# Altium footprint library Footprints.PcbLib: 236 footprints (part 10 of 15)
Each footprint in its own frame and in the unit in brackets; x right, y up, seen from the top. Pads: shape width x height; smd on the part's side, far side on the other; paste and mask are expansions set on the pad; w line width, h text height; cw(c..) or ccw(c..) is an arc to the next point about the centre after c.
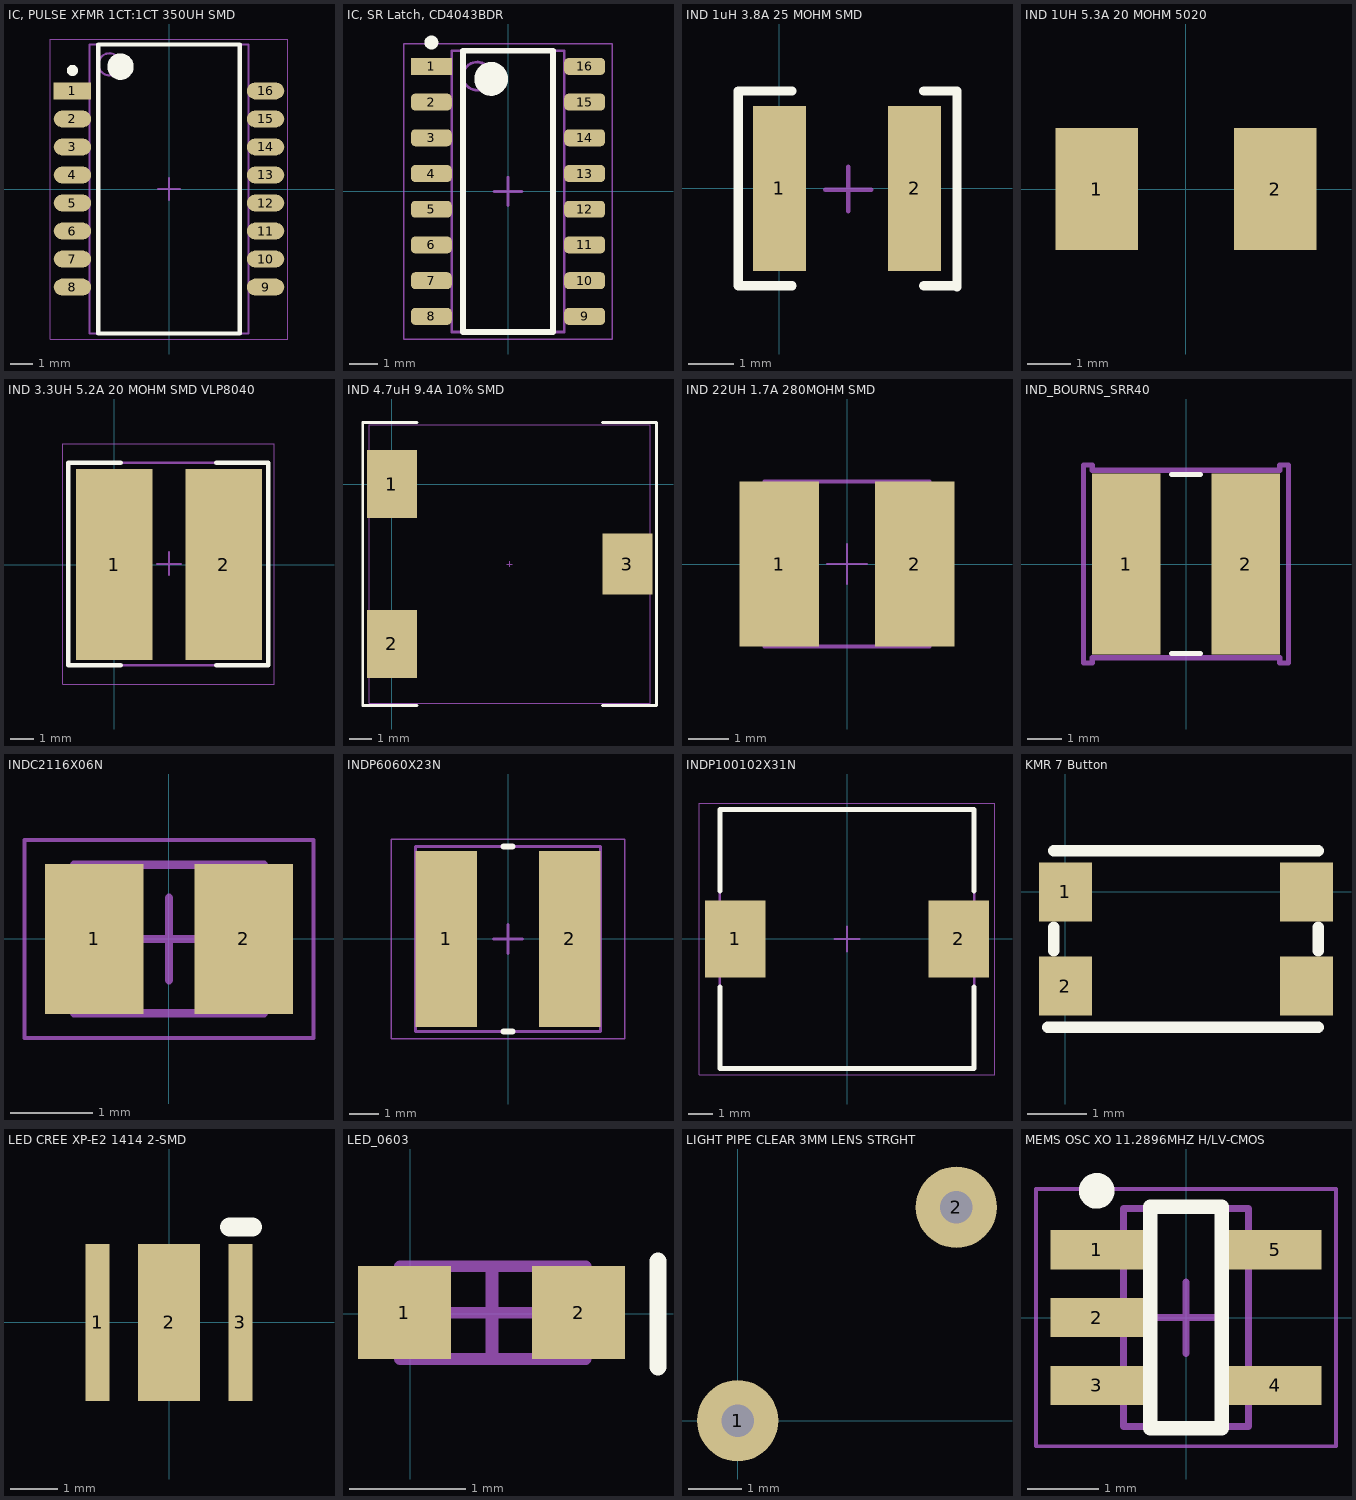
[diagram p9: the footprints below, top view; thin cyan lines are the x and y axes]

## IC, PULSE XFMR 1CT:1CT 350UH SMD [mm] "PULSE XFMR 1CT:1CT 350UH SMD"
height 5.9
pads (16):
  rect 1.7x0.76 smd: 1(-4.375,4.445)
  oval 1.7x0.76 smd: 2(-4.375,3.175) 3(-4.375,1.905) 4(-4.375,0.635) 5(-4.375,-0.635) 6(-4.375,-1.905) 7(-4.375,-3.175) 8(-4.375,-4.445) 9(4.375,-4.445) 10(4.375,-3.175) 11(4.375,-1.905) 12(4.375,-0.635) 13(4.375,0.635) 14(4.375,1.905) 15(4.375,3.175) 16(4.375,4.445)
Top Overlay:
  circle w0.6: c-2.2,5.55 r0.3
  circle w0.25: c-4.375,5.375 r0.125
  lines w0.2: -3.2,-6.55 3.2,-6.55 3.2,6.55 -3.2,6.55 -3.2,-6.55
Mechanical 13:
  circle w0.1: c-2.7,5.65 r0.5
  lines w0.1: -3.6,-6.55 3.6,-6.55 3.6,6.55 -3.6,6.55 -3.6,-6.55
Mechanical 15:
  lines w0.05: -5.375,-6.8 5.375,-6.8 5.375,6.8 -5.375,6.8 -5.375,-6.8
  lines w0.1: -0.5,0 0.5,0 ; 0,-0.5 0,0.5
3D body "1CT 350UH SMD.step": height 5.9, standoff 0, extent -4.65,-6.55 4.65,6.55

## IC, SR Latch, CD4043BDR [mm] "SR LATCH"
height 1.75
pads (16):
  rect 1.45x0.6 smd: 1(-2.725,4.445)
  rrect50% 1.45x0.6 smd: 2(-2.725,3.175) 3(-2.725,1.905) 4(-2.725,0.635) 5(-2.725,-0.635) 6(-2.725,-1.905) 7(-2.725,-3.175) 8(-2.725,-4.445) 9(2.725,-4.445) 10(2.725,-3.175) 11(2.725,-1.905) 12(2.725,-0.635) 13(2.725,0.635) 14(2.725,1.905) 15(2.725,3.175) 16(2.725,4.445)
Top Overlay:
  circle w0.6: c-0.6,4 r0.3
  circle w0.25: c-2.725,5.295 r0.125
  lines w0.2: -1.6,-5 1.6,-5 1.6,5 -1.6,5 -1.6,-5
Mechanical 13:
  circle w0.1: c-1.1,4.1 r0.5
  lines w0.1: -2,-5 2,-5 2,5 -2,5 -2,-5
Mechanical 15:
  lines w0.05: -3.7,-5.25 3.7,-5.25 3.7,5.25 -3.7,5.25 -3.7,-5.25
  lines w0.1: -0.5,0 0.5,0 ; 0,-0.5 0,0.5
3D body: height 1.75, standoff 0.1, extent -2,-5 2,5

## IND 1uH 3.8A 25 MOHM SMD [mm]
pads (2):
  rect 1.15x3.6 smd: 1(0,0) 2(2.95,0)
Top Overlay:
  lines w0.2: 0.275,-2.125 -0.9,-2.125 -0.9,2.125 0.275,2.125 ; 3.15,-2.125 3.875,-2.125 ; 3.15,2.125 3.875,2.125 ; 3.875,-2.15 3.875,2.1
Courtyard Top:
  lines w0.1: 1,-0.025 2,-0.025 ; 1.5,-0.5 1.5,0.475
3D body "IFSC-1515AH-01.STEP": height 1.65, standoff -0.06, extent -0.5,-2 3.45,1.95

## IND 1UH 5.3A 20 MOHM 5020 [mm]
pads (2):
  rect 1.9x2.8 smd: 1(-2.05,0) 2(2.05,0)
3D body "74437334010_Download_STP_WE-LHMI-5020_rev1.stp": height 1.8, standoff 0, extent -2.85,-2.6 2.85,2.6

## IND 3.3UH 5.2A 20 MOHM SMD VLP8040 [mm] "IND 3.3UH 5.2A 20 MOHM SMD"
height 4
pads (2):
  rect 3.3x8.2 smd: 1(0,0) 2(4.7,0)
Top Overlay:
  lines w0.2: 0.275,-4.325 -1.975,-4.325 -1.975,4.375 0.275,4.375 ; 4.375,-4.325 6.625,-4.325 6.625,4.375 4.375,4.375
Assembly Top:
  lines w0.1: -1.975,-4.325 -1.975,4.375 6.625,4.375 6.625,-4.325 -1.975,-4.325
Courtyard Top:
  lines w0.05: -2.225,-5.15 -2.225,5.2 6.875,5.2 6.875,-5.15 -2.225,-5.15
  lines w0.1: 1.85,0.025 2.85,0.025 ; 2.35,-0.45 2.35,0.525
3D body "IND 3.3UH 5.2A 20 MOHM SMD VLP8040.step": height 4.1, standoff 0, extent -1.625,-4.675 6.975,3.925

## IND 4.7uH 9.4A 10% SMD [mil]
pads (3):
  rect 89x121 smd: 1(0,0) 2(0,-284)
  rect 89x109 smd: 3(419,-142)
Top Overlay:
  lines w5: 44.5,-394 -52,-394 -52,110 44.5,110 ; 374.5,-394 471,-394 471,109.99 374.5,110
Mechanical 13:
  lines w1: 204.5,-142 214.5,-142 ; 209.5,-147 209.5,-137
3D Body Top (Mech14):
  lines w1: -40.5,-390 -40.5,106 459.5,106 459.5,-390 -40.5,-390
3D body "SER1360.STEP": height 228.38, standoff 0.03, extent -44.29,-401.87 467.52,106

## IND 22UH 1.7A 280MOHM SMD [mm] "SMT Shielded Power Inductor, body 4.1x4.1mm"
height 2.1
pads (2):
  rect 1.98x4.1 smd: 1(-1.685,0) 2(1.685,0)
Mechanical 13:
  lines w0.1: -2.05,-2.05 -2.05,2.05 2.05,2.05 2.05,-2.05 -2.05,-2.05
Mechanical 15:
  lines w0.05: -0.5,0 0.5,0 ; 0,-0.5 0,0.5
3D body "WE-IndMAPI_SSMC-4020.stp": height 2.1, standoff 0, extent -2.05,-2.05 2.05,2.05

## IND_BOURNS_SRR40 [mil]
pads (2):
  rect 79x209 smd: 1(-69,0) 2(69,0)
Top Overlay:
  lines w6: -16.4,-103.5 16.4,-103.5 ; -16.4,103.5 16.4,103.5
Mechanical 13:
  circle w0: c-95.5,0 r3
Mechanical 15:
  lines w6: -118.5,-114.5 -108.5,-114.5 -108.5,-108.5 108.5,-108.5 108.5,-114.5 118.5,-114.5 118.5,114.5 108.5,114.5 108.5,108.5 -108.5,108.5 -108.5,114.5 -118.5,114.5 -118.5,-114.5
3D body "IND_BOURNS_SRR4018.stp": height 79, standoff 0, extent -98.5,-104.5 98.5,104.5

## INDC2116X06N [mm] "Chip Inductor, 2-Leads, Body 2.10x1.60mm, IPC Medium Density"
height 0.6
pads (2):
  rect 1.19x1.82 smd: 1(-0.905,0) 2(0.905,0)
Mechanical 13:
  lines w0.1: -1.15,-0.9 -1.15,0.9 1.15,0.9 1.15,-0.9 -1.15,-0.9
Mechanical 15:
  lines w0.05: -1.75,-1.2 -1.75,1.2 1.75,1.2 1.75,-1.2 -1.75,-1.2
  lines w0.1: -0.5,0 0.5,0 ; 0,-0.5 0,0.5
3D body "INDC2116X06N.step": height 0.6, standoff 0, extent -1.15,-0.9 1.15,0.9

## INDP6060X23N [mm] "Precision Wire Wound Inductor, 2-Leads, Body 6.00x6.00mm, IPC Medium Density"
height 2.29
pads (2):
  rect 2.1x6 smd: 1(-2.1,0) 2(2.1,0)
Top Overlay:
  lines w0.2: -0.15,-3.15 0.15,-3.15 ; -0.15,3.15 0.15,3.15
Mechanical 13:
  lines w0.1: -3.15,-3.15 3.15,-3.15 3.15,3.15 -3.15,3.15 -3.15,-3.15
Mechanical 15:
  lines w0.05: -3.975,-3.4 3.975,-3.4 3.975,3.4 -3.975,3.4 -3.975,-3.4
  lines w0.1: -0.5,0 0.5,0 ; 0,-0.5 0,0.5
3D body "INDP6060X23N.step": height 2.39, standoff 0, extent -3.1,-3 3.1,3

## INDP100102X31N [mm] "Precision Wire Wound Inductor, 2-Leads, Body 10.00x10.20mm, IPC Medium Density"
height 3.1
pads (2):
  rect 2.45x3.1 smd: 1(-4.525,0) 2(4.525,0)
Top Overlay:
  lines w0.2: -5.15,-1.95 -5.15,-5.25 5.15,-5.25 5.15,-1.95 ; -5.15,1.95 -5.15,5.25 5.15,5.25 5.15,1.95
Mechanical 13:
  lines w0.1: -5.15,-5.25 5.15,-5.25 5.15,5.25 -5.15,5.25 -5.15,-5.25
Mechanical 15:
  lines w0.05: -5.975,-5.5 5.975,-5.5 5.975,5.5 -5.975,5.5 -5.975,-5.5
  lines w0.1: -0.5,0 0.5,0 ; 0,-0.5 0,0.5
3D body: height 3.1, standoff 0, extent -5.15,-5.25 5.15,5.25

## KMR 7 Button [mm]
pads (4):
  rect 0.9x1 smd: 1(0,0) 2(0,-1.6) ""(4.1,-1.6) ""(4.1,0)
Top Overlay:
  lines w0.2: -0.3,-2.3 4.3,-2.3 ; -0.2,-1 -0.2,-0.6 ; -0.2,0.7 4.3,0.7 ; 4.3,-1 4.3,-0.6

## LED CREE XP-E2 1414 2-SMD [mm]
pads (3):
  rect 0.5x3.3 smd: 1(-1.5,0) 3(1.5,0)
  rect 1.3x3.3 smd: 2(0,0)
Top Overlay:
  lines w0.4: 1.275,2 1.75,2
3D body "XLamp_XPG2_3D_STEP.stp": height 2.28, standoff 0.02, extent -1.725,-1.725 1.725,1.725

## LED_0603 [mm]
pads (2):
  rect 0.8x0.8 smd: 1(-0.05,0.01) 2(1.45,0.01)
Top Overlay:
  lines w0.15: 2.134,-0.457 2.134,0.453
Mechanical 13:
  rectangle: 1.296,-0.39 1.511,0.41
  lines w0.1: -0.089,-0.39 1.511,-0.39 1.511,0.41 -0.089,0.41 -0.089,-0.39
Mechanical 15:
  lines w0.1: 0.3,0.01 1.1,0.01 ; 0.311,0.01 1.111,0.01 ; 0.7,-0.39 0.7,0.41 ; 0.711,-0.39 0.711,0.41
3D body: height 0.3, standoff 0, extent -0.089,-0.39 1.511,0.41
3D body: height 0.8, standoff 0.3, extent 0.203,-0.295 1.219,0.315

## LIGHT PIPE CLEAR 3MM LENS STRGHT [mm] "Light Pipe Single Clear Rigid Round with Flat Top, 3mm Panel Mount, Press Fit"
pads (2):
  round 1.524 hole 0.61 unplated: 1(0,0) 2(4.1,4)
3D body "VF-350-F.step": height 8.89, standoff -1.52, extent -0.299,-0.35 4.4,4.349

## MEMS OSC XO 11.2896MHZ H/LV-CMOS [mm] "11.2896MHz XO (Standard) HCMOS, LVCMOS Oscillator 3.3V Enable/Disable SC-74A, SOT-753"
height 1.45
pads (5):
  rect 1.3x0.55 smd: 1(-1.25,0.95) 2(-1.25,0) 3(-1.25,-0.95) 4(1.25,-0.95) 5(1.25,0.95)
Top Overlay:
  circle w0.25: c-1.25,1.775 r0.125
  lines w0.2: -0.5,-1.55 0.5,-1.55 0.5,1.55 -0.5,1.55 -0.5,-1.55
Assembly Top (Mech9):
  lines w0.1: -0.875,-1.525 -0.875,1.525 0.875,1.525 0.875,-1.525 -0.875,-1.525
Courtyard Top (Mech11):
  lines w0.05: -2.1,-1.8 -2.1,1.8 2.1,1.8 2.1,-1.8 -2.1,-1.8
  lines w0.1: -0.5,0 0.5,0 ; 0,-0.5 0,0.5
3D body "SOT95P280X145-5N.step": height 1.45, standoff 0, extent -1.4,-1.475 1.4,1.475